# Altium footprint library North POLE.PcbLib: 419 footprints (part 20 of 27)
Each footprint in its own frame and in the unit in brackets; x right, y up, seen from the top. Pads: shape width x height; smd on the part's side, far side on the other; paste and mask are expansions set on the pad; w line width, h text height; cw(c..) or ccw(c..) is an arc to the next point about the centre after c.
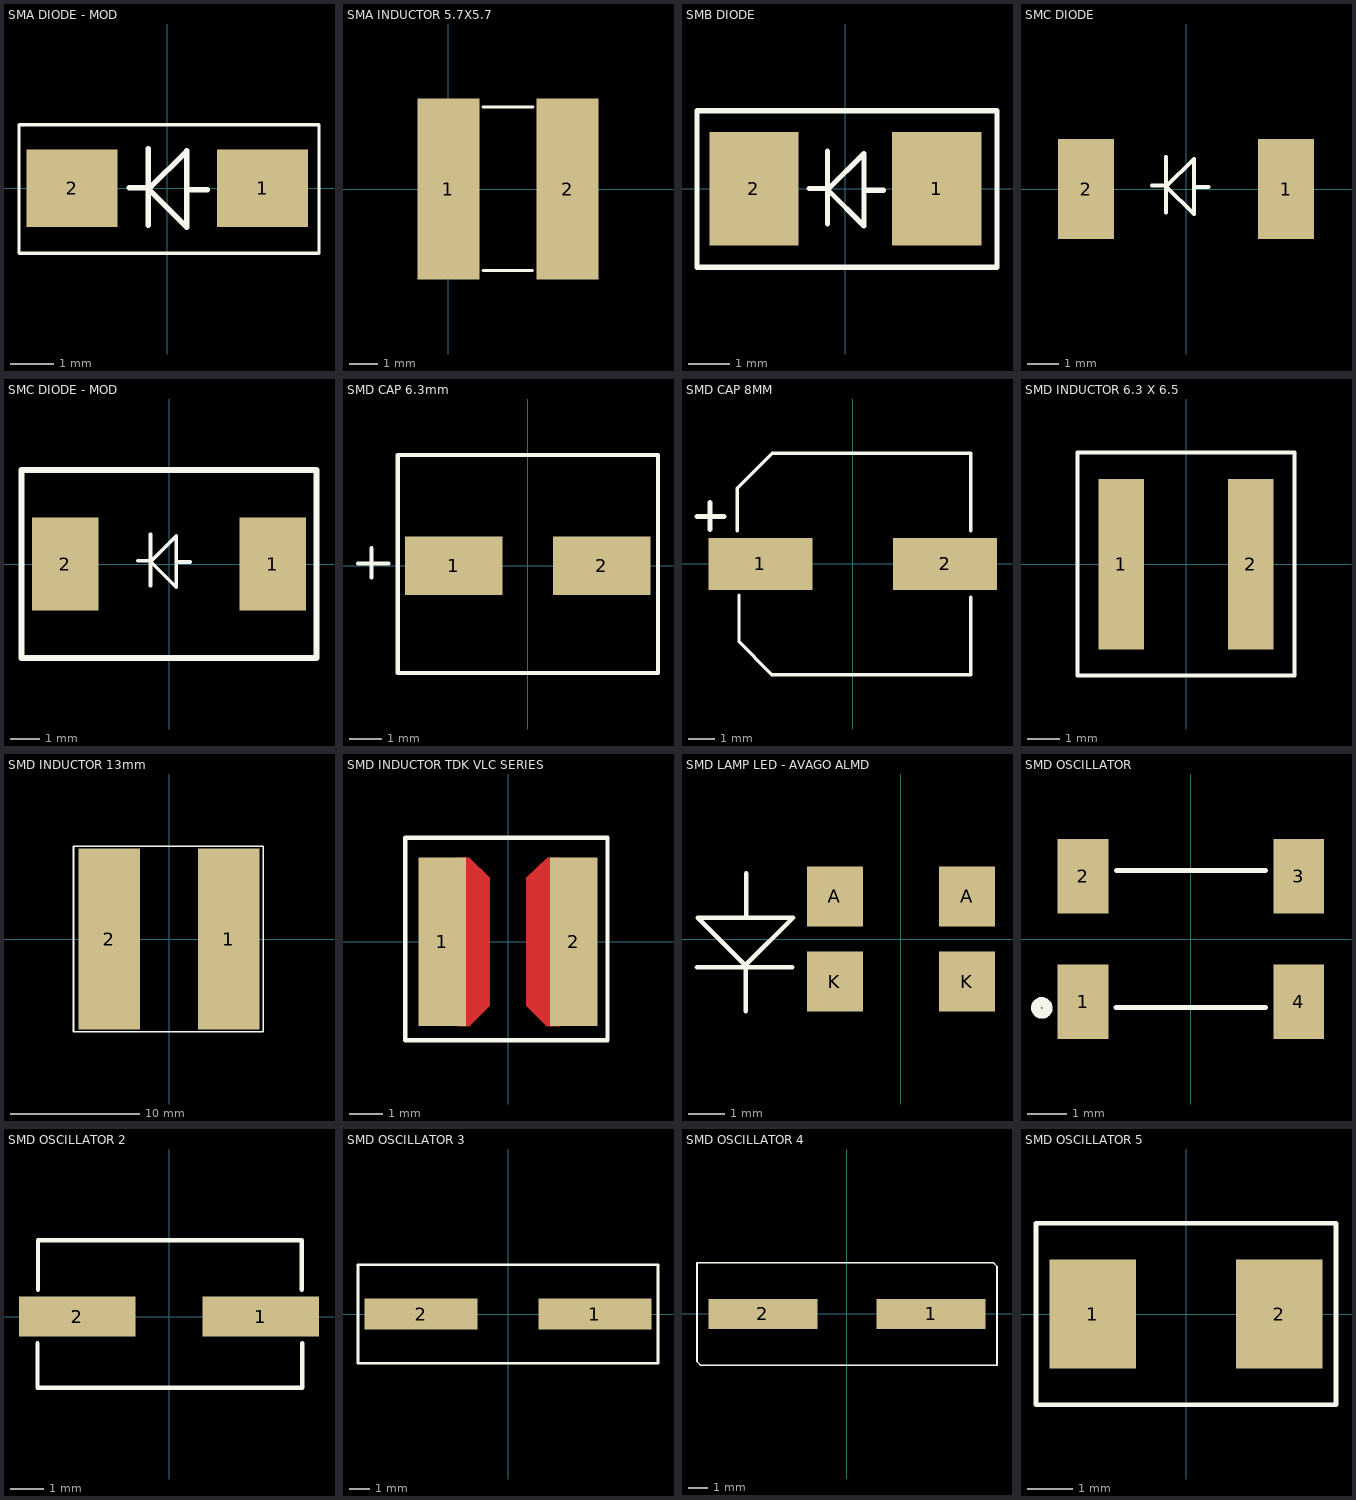
[diagram p19: the footprints below, top view; thin cyan lines are the x and y axes]

## SMA DIODE - MOD [mil]
pads (2):
  rect 82x70 smd mask+3.15: 1(86,0) 2(-86,0)
Top Overlay:
  lines w3: -134,-58.66 -134,57.52 137,57.52 137,-58.66 -134,-58.66
  lines w5: -34.41,0.36 -16.23,0.36 ; -17.16,-33.3 -17.16,35.79 ; -16.83,-0.76 17.68,-35.27 17.68,33.83 -16.83,-0.68 ; 18.42,-1.22 36.1,-1.22
3D body: height 90.75, standoff -3.94, extent -102.36,-51.05 102.36,51.31

## SMA INDUCTOR 5.7X5.7 [mm] "rectangle pad sma inductor"
pads (2):
  rect 2.15x6.3 smd: 1(0,0) 2(4.15,0)
Top Overlay:
  lines w0.1: 1.2,-2.84 2.93,-2.84 ; 1.21,2.86 2.94,2.86

## SMB DIODE [mm]
pads (2):
  rect 2.159x2.743 smd mask+0.08: 1(2.21,0) 2(-2.21,0)
Top Overlay:
  lines w0.127: -0.874,0.009 -0.412,0.009 ; -0.436,-0.846 -0.436,0.909 ; -0.427,-0.019 0.449,-0.896 0.449,0.859 -0.427,-0.017 ; 0.468,-0.031 0.917,-0.031 ; -3.586,-1.89 -3.586,1.887 3.663,1.887 3.663,-1.89 -3.586,-1.89
3D body: height 2.3, standoff 0, extent -2.7,-1.797 2.7,1.803

## SMC DIODE [mil]
pads (2):
  rect 70x125 smd mask+3.15: 1(125,0) 2(-125,0)
Top Overlay:
  lines w5: -42.28,4.29 -24.1,4.29 ; -25.04,-29.36 -25.04,39.73 ; -24.7,3.18 9.81,-31.33 9.81,37.76 -24.7,3.25 ; 10.54,2.72 28.23,2.72
3D body: height 90.75, standoff 0, extent -156.5,-115 156.5,117.28

## SMC DIODE - MOD [mil]
pads (2):
  rect 90x125 smd mask+3.15: 1(140,0) 2(-140,0)
Top Overlay:
  lines w5: -42.28,4.29 -24.1,4.29 ; -25.04,-29.36 -25.04,39.73 ; -24.7,3.18 9.81,-31.33 9.81,37.76 -24.7,3.25 ; 10.54,2.72 28.23,2.72
  lines w8: -199,-127 -199,127 199,127 199,-127 -199,-127
3D body: height 90.75, standoff 0, extent -156.5,-115 156.5,117.28

## SMD CAP 6.3mm [mm]
pads (2):
  rect 3x1.8 smd mask+0.08: 1(-2.275,0) 2(2.275,0)
Top Overlay:
  lines w0.127: -5.223,0.066 -4.291,0.066 ; -4.809,-0.368 -4.809,0.536 ; -4,-3.3 4,-3.3 4,3.4 -3.451,3.4 -4,3.4 -4,-3.3
3D body: height 3.91, standoff 0, extent -3.449,-3.251 3.551,3.349

## SMD CAP 8MM [mm]
pads (2):
  rect 4x2 smd mask+0.08: 1(-3.55,0) 2(3.55,0)
Top Overlay:
  lines w0.127: -4.445,1.27 -4.445,2.908 -3.101,4.252 4.539,4.252 4.539,1.27 ; -4.374,-1.209 -4.374,-3.005 -3.17,-4.209 -3.114,-4.265 4.54,-4.265 4.54,-1.283
  lines w0.2: -5.992,1.821 -4.961,1.821 ; -5.491,1.326 -5.491,2.357
3D body: height 10.2, standoff 0, extent -4.866,-4.165 5.034,4.135

## SMD INDUCTOR 6.3 X 6.5 [mm]
pads (2):
  rect 1.43x5.33 smd mask+0.08: 1(-2.02,0) 2(2.02,0)
Top Overlay:
  lines w0.127: -3.388,-3.485 -3.388,3.49 3.393,3.49 3.393,-3.485 -3.388,-3.485
3D body: height 6, standoff -0.1, extent -3.28,-3.38 3.28,3.38

## SMD INDUCTOR 13mm [mm]
pads (2):
  rect 4.75x14 smd mask+0.08: 1(4.625,0) 2(-4.625,0)
Top Overlay:
  lines w0.127: -7.4,-7.2 -7.4,7.2 7.3,7.2 7.3,-7.2 -7.4,-7.2
3D body: height 7, standoff 0, extent -6.398,-6.335 6.551,6.64

## SMD INDUCTOR TDK VLC SERIES [mm]
pads (2):
  rect 1.4x5 smd mask+0.08: 1(-1.95,0) 2(1.95,0)
Top Layer:
  region: 1.519,-2.499 1.151,-2.499 0.546,-1.895 0.546,1.9 1.163,2.499 1.509,2.499 1.509,-2.489
  region: -1.519,2.499 -1.151,2.499 -0.546,1.895 -0.546,-1.9 -1.148,-2.51 -1.509,-2.499 -1.509,2.489
Top Overlay:
  lines w0.127: -3.048,-2.916 -3.048,3.084 2.952,3.084 2.952,-2.916 -3.048,-2.916
Top Solder:
  region: 1.171,-2.581 0.505,-1.915 0.493,-1.915 0.493,1.908 1.168,2.583
  region: -1.171,2.581 -0.505,1.915 -0.493,1.915 -0.493,-1.908 -1.168,-2.583
3D body: height 4.5, standoff 0, extent -3.048,-2.916 2.952,3.084

## SMD LAMP LED - AVAGO ALMD [mm]
pads (4):
  rect 1.55x1.65 smd: A(-1.825,1.175) A(1.825,1.175) K(-1.825,-1.175) K(1.825,-1.175)
Top Overlay:
  lines w0.127: -5.63,-0.785 -3,-0.785 ; -4.295,-0.73 -2.98,0.585 -5.61,0.585 -4.283,-0.743 ; -4.28,-1.99 -4.28,-0.815 ; -4.275,0.64 -4.275,1.815
3D body: height 6.5, standoff 0, extent -2.083,-2.096 2.1,2.096
3D body: height 3.4, standoff 0, extent -2.134,-2.134 2.108,2.159

## SMD OSCILLATOR [mm]
pads (4):
  rect 1.3x1.9 smd: 1(-2.75,-1.6) 2(-2.75,1.6) 3(2.75,1.6) 4(2.75,-1.6)
Top Overlay:
  lines w0.127: -1.908,-1.748 1.902,-1.748 ; -1.902,1.748 1.908,1.748
  lines w0.254: -3.713,-1.641 ccw(c-3.804,-1.758) -3.692,-1.661
3D body: height 1.5, standoff 0, extent -3.562,-1.55 3.538,1.55

## SMD OSCILLATOR 2 [mm]
pads (2):
  rect 3.5x1.2 smd: 1(2.75,0) 2(-2.75,0)
Top Overlay:
  lines w0.127: -3.942,-0.803 -3.942,-2.136 3.998,-2.136 3.998,-0.803 ; -3.932,0.803 -3.932,2.291 3.98,2.291 3.98,0.803
3D body: height 2.3, standoff 0, extent -3.782,-1.956 3.818,2.144

## SMD OSCILLATOR 3 [mm]
pads (2):
  rect 5.5x1.5 smd: 1(4.25,0) 2(-4.25,0)
Top Overlay:
  lines w0.127: -7.328,2.401 -7.328,-2.4 7.315,-2.4 ; -7.327,2.4 -6.405,2.4 7.328,2.4 7.328,-2.401
3D body: height 4.3, standoff 0, extent -6.405,-2.43 6.395,2.4

## SMD OSCILLATOR 4 [mm]
pads (2):
  rect 5.5x1.5 smd: 1(4.251,-0.002) 2(-4.249,-0.002)
Top Overlay:
  lines w0.076: -7.588,-2.412 -7.409,-2.591 7.59,-2.607 7.59,2.408 7.411,2.587 -7.588,2.603 -7.588,-2.412
3D body: height 0.6, standoff 0, extent -5.687,-2.466 5.474,2.479

## SMD OSCILLATOR 5 [mm]
pads (2):
  rect 1.9x2.4 smd: 1(-2.05,0) 2(2.05,0)
Top Overlay:
  lines w0.1: -3.3,-2 -3.3,2 3.3,2 3.3,-2 -3.3,-2
3D body: height 1.3, standoff 0, extent -2.532,-1.633 2.746,1.631